# Altium footprint library PowerProducts.PCBLIB: 166 footprints (part 1 of 11)
Each footprint in its own frame and in the unit in brackets; x right, y up, seen from the top. Pads: shape width x height; smd on the part's side, far side on the other; paste and mask are expansions set on the pad; w line width, h text height; cw(c..) or ccw(c..) is an arc to the next point about the centre after c.
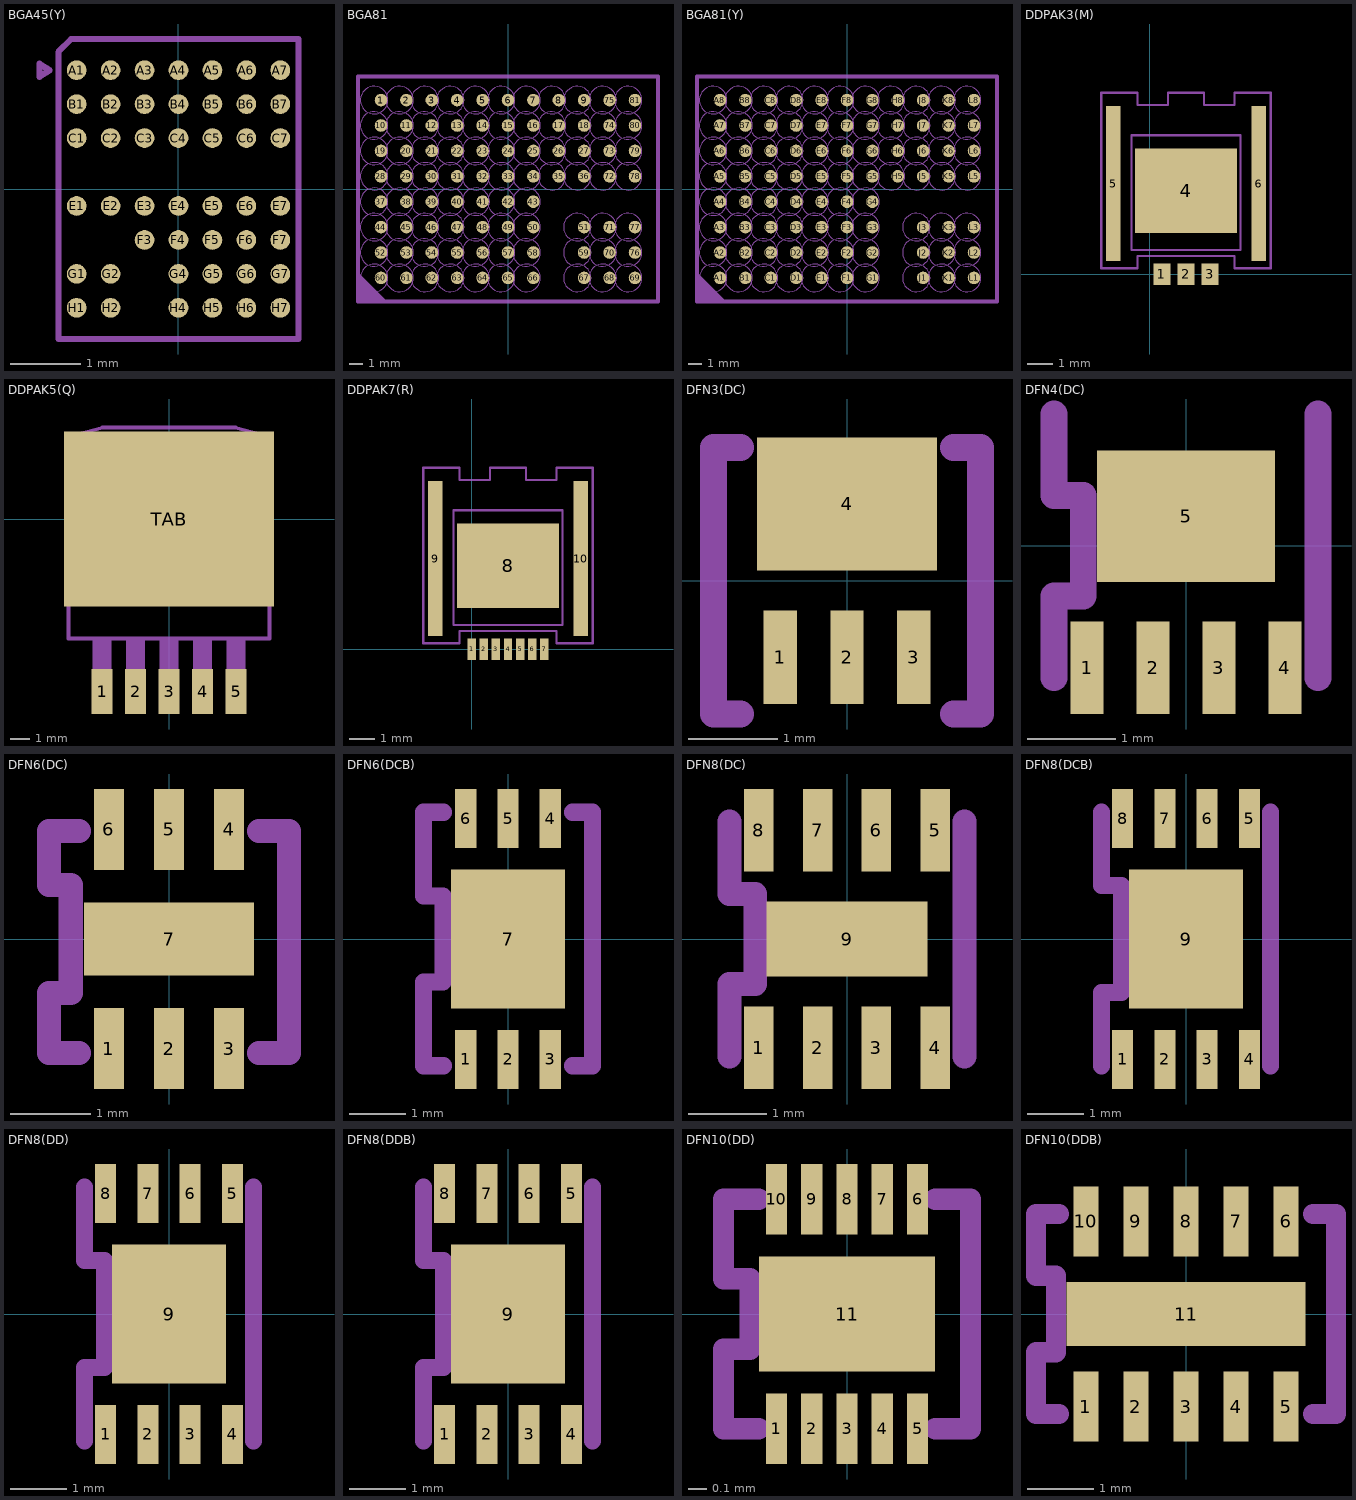
[diagram p0: the footprints below, top view; thin cyan lines are the x and y axes]

## BGA45(Y) [mil]
pads (45):
  rrect100% 11.05x11.05 smd: A1(-57.15,66.68) A2(-38.1,66.68) A3(-19.05,66.68) A4(0,66.68) A5(19.05,66.68) A6(38.1,66.68) A7(57.15,66.68) B1(-57.15,47.63) B2(-38.1,47.63) B3(-19.05,47.63) B4(0,47.63) B5(19.05,47.63) B6(38.1,47.63) B7(57.15,47.63) C1(-57.15,28.58) C2(-38.1,28.58) C3(-19.05,28.58) C4(0,28.58) C5(19.05,28.58) C6(38.1,28.58) C7(57.15,28.58) E1(-57.15,-9.53) E2(-38.1,-9.53) E3(-19.05,-9.53) E4(0,-9.53) E5(19.05,-9.53) E6(38.1,-9.53) E7(57.15,-9.53) F3(-19.05,-28.58) F4(0,-28.58) F5(19.05,-28.58) F6(38.1,-28.58) F7(57.15,-28.58) G1(-57.15,-47.63) G2(-38.1,-47.63) G4(0,-47.63) G5(19.05,-47.63) G6(38.1,-47.63) G7(57.15,-47.63) H1(-57.15,-66.68) H2(-38.1,-66.68) H4(0,-66.68) H5(19.05,-66.68) H6(38.1,-66.68) H7(57.15,-66.68)
Mechanical 2:
  lines w3.43: -78.1,62.87 -72.39,66.68 -78.1,70.49 -78.1,62.87 ; -67.44,-84.2 67.44,-84.2 67.44,84.2 -60.2,84.2 -67.44,76.96 -67.44,-84.2

## BGA81 [mil]
pads (81):
  rrect100% 37.2x37.2 smd: 1(-375,262.5) 2(-300,262.5) 3(-225,262.5) 4(-150,262.5) 5(-75,262.5) 6(0,262.5) 7(75,262.5) 8(150,262.5) 9(225,262.5) 10(-375,187.5) 11(-300,187.5) 12(-225,187.5) 13(-150,187.5) 14(-75,187.5) 15(0,187.5) 16(75,187.5) 17(150,187.5) 18(225,187.5) 19(-375,112.5) 20(-300,112.5) 21(-225,112.5) 22(-150,112.5) 23(-75,112.5) 24(0,112.5) 25(75,112.5) 26(150,112.5) 27(225,112.5) 28(-375,37.5) 29(-300,37.5) 30(-225,37.5) 31(-150,37.5) 32(-75,37.5) 33(0,37.5) 34(75,37.5) 35(150,37.5) 36(225,37.5) 37(-375,-37.5) 38(-300,-37.5) 39(-225,-37.5) 40(-150,-37.5) 41(-75,-37.5) 42(0,-37.5) 43(75,-37.5) 44(-375,-112.5) 45(-300,-112.5) 46(-225,-112.5) 47(-150,-112.5) 48(-75,-112.5) 49(0,-112.5) 50(75,-112.5) 51(225,-112.5) 52(-375,-187.5) 53(-300,-187.5) 54(-225,-187.5) 55(-150,-187.5) 56(-75,-187.5) 57(0,-187.5) 58(75,-187.5) 59(225,-187.5) 60(-375,-262.5) 61(-300,-262.5) 62(-225,-262.5) 63(-150,-262.5) 64(-75,-262.5) 65(0,-262.5) 66(75,-262.5) 67(225,-262.5) 68(300,-262.5) 69(375,-262.5) 70(300,-187.5) 71(300,-112.5) 72(300,37.5) 73(300,112.5) 74(300,187.5) 75(300,262.5) 76(375,-187.5) 77(375,-112.5) 78(375,37.5) 79(375,112.5) 80(375,187.5) 81(375,262.5)
Mechanical 2:
  drawing of 172 lines, arcs and shapes, not listed

## BGA81(Y) [mil]
pads (81):
  rrect100% 37.2x37.2 smd: A1(-375,-262.5) A2(-375,-187.5) A3(-375,-112.5) A4(-375,-37.5) A5(-375,37.5) A6(-375,112.5) A7(-375,187.5) A8(-375,262.5) B1(-300,-262.5) B2(-300,-187.5) B3(-300,-112.5) B4(-300,-37.5) B5(-300,37.5) B6(-300,112.5) B7(-300,187.5) B8(-300,262.5) C1(-225,-262.5) C2(-225,-187.5) C3(-225,-112.5) C4(-225,-37.5) C5(-225,37.5) C6(-225,112.5) C7(-225,187.5) C8(-225,262.5) D1(-150,-262.5) D2(-150,-187.5) D3(-150,-112.5) D4(-150,-37.5) D5(-150,37.5) D6(-150,112.5) D7(-150,187.5) D8(-150,262.5) E1(-75,-262.5) E2(-75,-187.5) E3(-75,-112.5) E4(-75,-37.5) E5(-75,37.5) E6(-75,112.5) E7(-75,187.5) E8(-75,262.5) F1(0,-262.5) F2(0,-187.5) F3(0,-112.5) F4(0,-37.5) F5(0,37.5) F6(0,112.5) F7(0,187.5) F8(0,262.5) G1(75,-262.5) G2(75,-187.5) G3(75,-112.5) G4(75,-37.5) G5(75,37.5) G6(75,112.5) G7(75,187.5) G8(75,262.5) H5(150,37.5) H6(150,112.5) H7(150,187.5) H8(150,262.5) J1(225,-262.5) J2(225,-187.5) J3(225,-112.5) J5(225,37.5) J6(225,112.5) J7(225,187.5) J8(225,262.5) K1(300,-262.5) K2(300,-187.5) K3(300,-112.5) K5(300,37.5) K6(300,112.5) K7(300,187.5) K8(300,262.5) L1(375,-262.5) L2(375,-187.5) L3(375,-112.5) L5(375,37.5) L6(375,112.5) L7(375,187.5) L8(375,262.5)
Mechanical 2:
  drawing of 172 lines, arcs and shapes, not listed

## DDPAK3(M) [mil]
pads (6):
  rect 26.67x34.29 smd: 1(19.05,0) 2(57.15,0) 3(95.25,0)
  rect 160.02x133.35 smd: 4(57.15,131.45)
  rect 22.86x243.84 smd: 5(-57.15,142.88) 6(171.45,142.88)
Mechanical 2:
  lines w3.43: -76.2,9.53 -19.05,9.53 -19.05,28.58 133.35,28.58 133.35,9.53 190.5,9.53 190.5,285.75 133.35,285.75 133.35,266.7 85.73,266.7 85.73,285.75 28.58,285.75 28.58,266.7 -19.05,266.7 -19.05,285.75 -76.2,285.75 -76.2,9.53 ; -28.58,38.1 142.88,38.1 142.88,219.08 -28.58,219.08 -28.58,38.1

## DDPAK5(Q) [mil]
pads (6):
  rect 42x90 smd: 1(-134,-345) 2(-67,-345) 3(0,-345) 4(67,-345) 5(134,-345)
  rect 420x350 smd: TAB(0,0)
Mechanical 2:
  rectangle: -153,-301.86 -115,-235.86
  rectangle: -86,-301.86 -48,-235.86
  rectangle: -19,-301.86 19,-235.86
  rectangle: 48,-301.86 86,-235.86
  rectangle: 115,-301.86 153,-235.86
  lines w3.81: -85.73,-161.93 85.73,-161.93 85.73,72.39 -85.73,72.39 -85.73,-161.93
  lines w8: -200.55,-239.24 200.55,-239.24
Mechanical 18:
  rectangle: -153,-385.86 -115,-300.86
  rectangle: -86,-385.86 -48,-300.86
  rectangle: -19,-385.86 19,-300.86
  rectangle: 48,-385.86 86,-300.86
  rectangle: 115,-385.86 153,-300.86
  region: 0,0 10,0 10,10 0,10
  lines w8: -200.55,-239.24 -200.55,131.62 200.55,131.62 200.55,-239.24 ; -200.98,135.64 -200.98,164.61 -132.99,182.61 132.99,182.61 200.98,164.61 200.98,135.64 -200.98,135.64

## DDPAK7(R) [mil]
pads (10):
  rect 13.34x34.29 smd: 1(0,0) 2(19.05,0) 3(38.1,0) 4(57.15,0) 5(76.2,0) 6(95.25,0) 7(114.3,0)
  rect 160.02x133.35 smd: 8(57.15,131.45)
  rect 22.86x243.84 smd: 9(-57.15,142.88) 10(171.45,142.88)
Mechanical 2:
  lines w3.43: -76.2,9.53 -19.05,9.53 -19.05,28.58 133.35,28.58 133.35,9.53 190.5,9.53 190.5,285.75 133.35,285.75 133.35,266.7 85.73,266.7 85.73,285.75 28.58,285.75 28.58,266.7 -19.05,266.7 -19.05,285.75 -76.2,285.75 -76.2,9.53 ; -28.58,38.1 142.88,38.1 142.88,219.08 -28.58,219.08 -28.58,38.1

## DFN3(DC) [mil]
pads (4):
  rect 14.76x41.34 smd: 1(-29.53,-33.96) 2(0,-33.96) 3(29.53,-33.96)
  rect 79.72x59.06 smd: 4(0,33.96)
Mechanical 2:
  lines w12: -47.24,-59.06 -59.06,-59.06 -59.06,59.06 -47.24,59.06 ; 47.24,-59.06 59.06,-59.06 59.06,59.06 47.24,59.06

## DFN4(DC) [mil]
pads (5):
  rect 14.76x41.34 smd: 1(-44.29,-54.63) 2(-14.76,-54.63) 3(14.76,-54.63) 4(44.29,-54.63)
  rect 79.72x59.06 smd: 5(0,13.29)
Mechanical 2:
  lines w12: -59.06,-59.06 -59.06,-22.5 -46.06,-22.5 -46.06,22.5 -59.06,22.5 -59.06,59.06 ; 59.06,-59.06 59.06,59.06

## DFN6(DC) [mil]
pads (7):
  rect 14.76x39.86 smd: 1(-29.53,-53.89) 2(0,-53.89) 3(29.53,-53.89) 4(29.53,53.89) 5(0,53.89) 6(-29.53,53.89)
  rect 83.86x36.02 smd: 7(0,0)
Mechanical 2:
  lines w12: -44.29,-56.1 -59.06,-56.1 -59.06,-26.57 -48.43,-26.57 -48.43,26.57 -59.06,26.57 -59.06,53.15 -44.29,53.15 ; 44.29,-56.1 59.06,-56.1 59.06,53.15 44.29,53.15

## DFN6(DCB) [mil]
pads (7):
  rect 14.76x41.34 smd: 1(-29.53,-84.15) 2(0,-84.15) 3(29.53,-84.15) 4(29.53,84.15) 5(0,84.15) 6(-29.53,84.15)
  rect 79.72x97.44 smd: 7(0,0)
Mechanical 2:
  lines w12: -45,-88.58 -59.06,-88.58 -59.06,-30 -45.47,-30 -45.47,30 -59.06,30 -59.06,88.58 -45,88.58 ; 45,-88.58 59.06,-88.58 59.06,88.58 45,88.58

## DFN8(DC) [mil]
pads (9):
  rect 14.76x41.34 smd: 1(-44.29,-54.63) 2(-14.76,-54.63) 3(14.76,-54.63) 4(44.29,-54.63) 5(44.29,54.63) 6(14.76,54.63) 7(-14.76,54.63) 8(-44.29,54.63)
  rect 80.91x37.8 smd: 9(0,0)
Mechanical 2:
  lines w12: -59.06,-59.06 -59.06,-22.5 -46.06,-22.5 -46.06,22.5 -59.06,22.5 -59.06,59.06 ; 59.06,-59.06 59.06,59.06

## DFN8(DCB) [mil]
pads (9):
  rect 14.76x41.34 smd: 1(-44.29,-84.15) 2(-14.76,-84.15) 3(14.76,-84.15) 4(44.29,-84.15) 5(44.29,84.15) 6(14.76,84.15) 7(-14.76,84.15) 8(-44.29,84.15)
  rect 79.72x97.44 smd: 9(0,0)
Mechanical 2:
  lines w12: -59.06,-88.58 -59.06,-37.5 -45,-37.5 -45,37.5 -59.06,37.5 -59.06,88.58 ; 59.06,-88.58 59.06,88.58

## DFN8(DD) [mil]
pads (9):
  rect 14.76x41.34 smd: 1(-44.29,-84.15) 2(-14.76,-84.15) 3(14.76,-84.15) 4(44.29,-84.15) 5(44.29,84.15) 6(14.76,84.15) 7(-14.76,84.15) 8(-44.29,84.15)
  rect 79.72x97.44 smd: 9(0,0)
Mechanical 2:
  lines w12: -59.06,-88.58 -59.06,-37.5 -45,-37.5 -45,37.5 -59.06,37.5 -59.06,88.58 ; 59.06,-88.58 59.06,88.58

## DFN8(DDB) [mil]
pads (9):
  rect 14.76x41.34 smd: 1(-44.29,-84.15) 2(-14.76,-84.15) 3(14.76,-84.15) 4(44.29,-84.15) 5(44.29,84.15) 6(14.76,84.15) 7(-14.76,84.15) 8(-44.29,84.15)
  rect 79.72x97.44 smd: 9(0,0)
Mechanical 2:
  lines w12: -59.06,-88.58 -59.06,-37.5 -45,-37.5 -45,37.5 -59.06,37.5 -59.06,88.58 ; 59.06,-88.58 59.06,88.58

## DFN10(DD) [mil]
pads (11):
  rect 4.57x15.24 smd: 1(-15.24,-24.77) 2(-7.62,-24.77) 3(0,-24.77) 4(7.62,-24.77) 5(15.24,-24.77) 6(15.24,24.77) 7(7.62,24.77) 8(0,24.77) 9(-7.62,24.77) 10(-15.24,24.77)
  rect 38.1x24.77 smd: 11(0,0)
Mechanical 2:
  lines w4.57: -19.05,-24.77 -26.67,-24.77 -26.67,-7.62 -20.96,-7.62 -20.96,7.62 -26.67,7.62 -26.67,24.77 -19.05,24.77 ; 19.05,-24.77 26.67,-24.77 26.67,24.77 19.05,24.77

## DFN10(DDB) [mil]
pads (11):
  rect 14.76x41.34 smd: 1(-59.06,-54.63) 2(-29.53,-54.63) 3(0,-54.63) 4(29.53,-54.63) 5(59.06,-54.63) 6(59.06,54.63) 7(29.53,54.63) 8(0,54.63) 9(-29.53,54.63) 10(-59.06,54.63)
  rect 141.14x37.8 smd: 11(0,0)
Mechanical 2:
  lines w12: -75,-59.06 -88.58,-59.06 -88.58,-22.5 -76.77,-22.5 -76.77,22.5 -88.58,22.5 -88.58,59.06 -75,59.06 ; 75,-59.06 88.58,-59.06 88.58,59.06 75,59.06